# Altium footprint library KNR_Kurs.PcbLib: 250 footprints (part 13 of 16)
Each footprint in its own frame and in the unit in brackets; x right, y up, seen from the top. Pads: shape width x height; smd on the part's side, far side on the other; paste and mask are expansions set on the pad; w line width, h text height; cw(c..) or ccw(c..) is an arc to the next point about the centre after c.
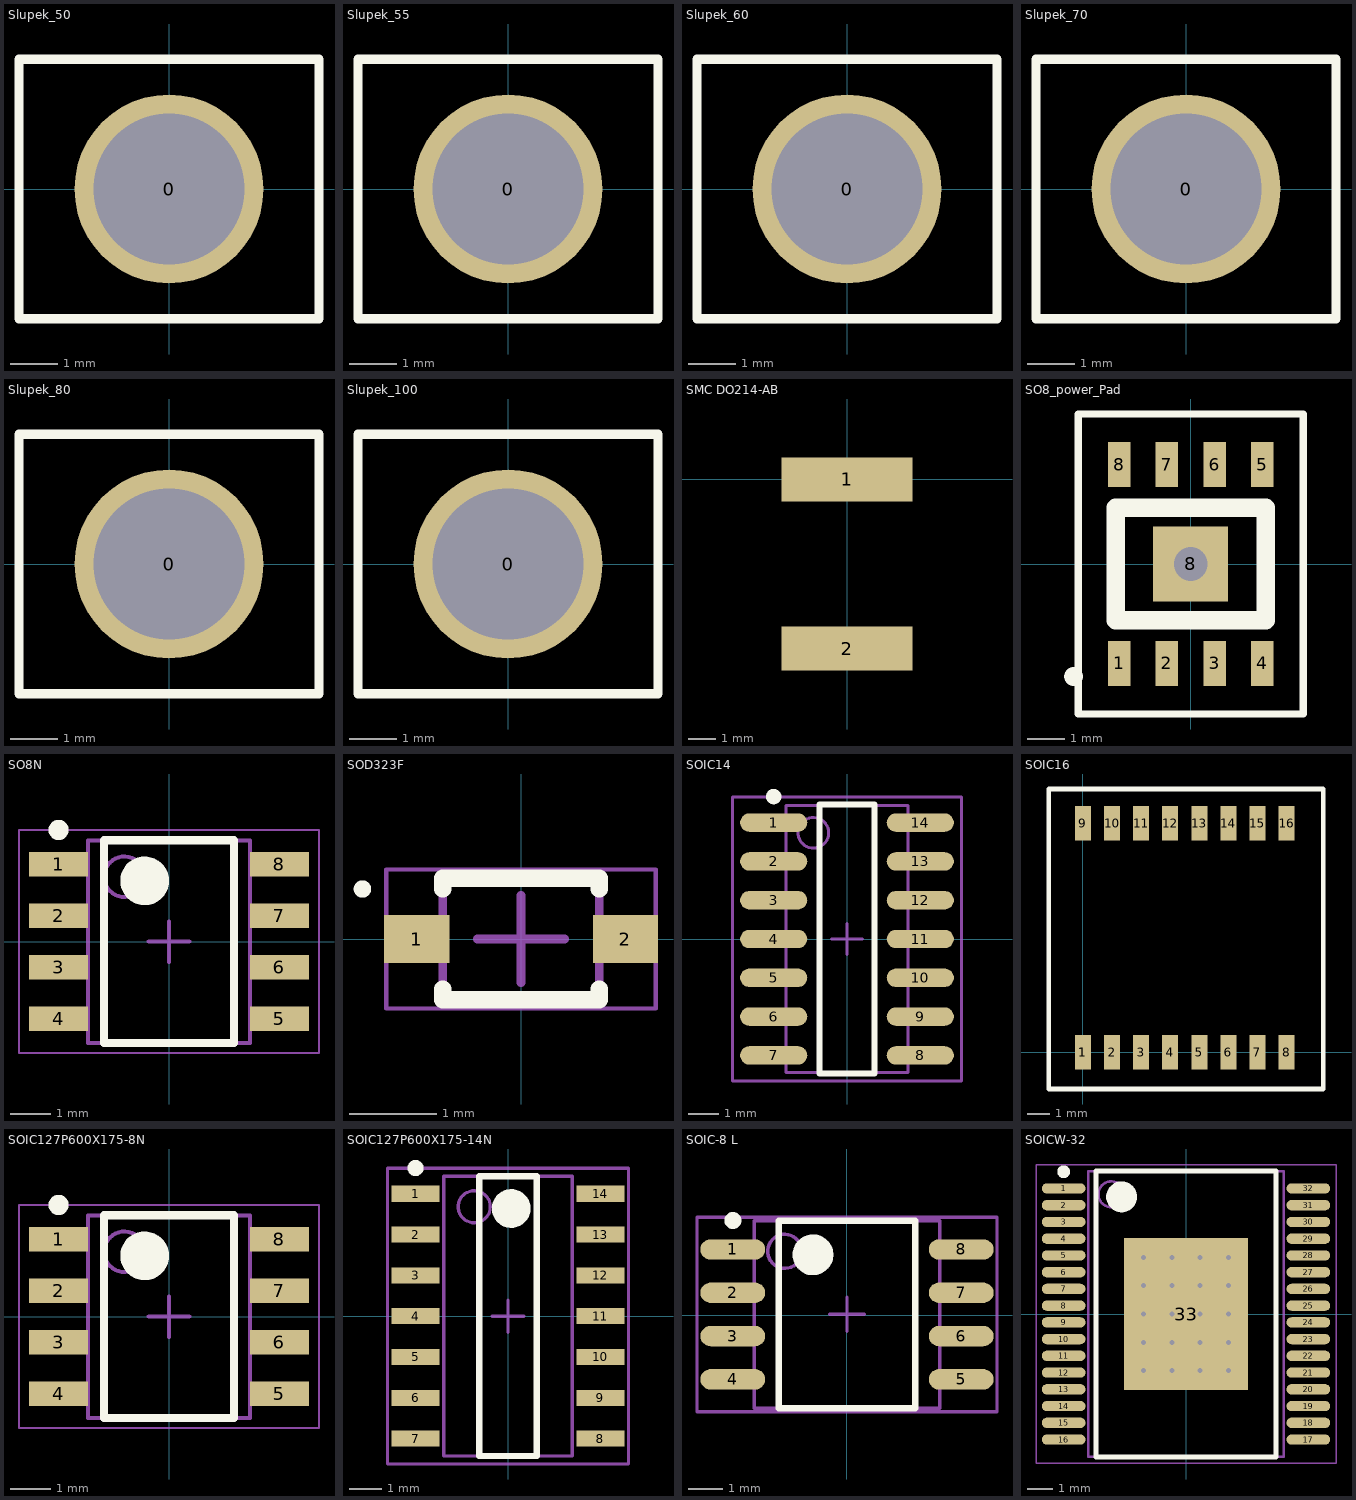
[diagram p12: the footprints below, top view; thin cyan lines are the x and y axes]

## Slupek_50 [mm] "M3, 5.5mm width"
pads (1):
  round 4 hole 3.2: 0(0,0)
Top Overlay:
  lines w0.2: -3.175,-2.75 -3.175,2.75 3.175,2.75 3.175,-2.75 -3.175,-2.75
3D body "Slupek_50.stp": height 50, standoff 0, extent -3.175,-2.75 3.175,2.75

## Slupek_55 [mm] "M3, 5.5mm width"
pads (1):
  round 4 hole 3.2: 0(0,0)
Top Overlay:
  lines w0.2: -3.175,-2.75 -3.175,2.75 3.175,2.75 3.175,-2.75 -3.175,-2.75
3D body "Slupek_55.stp": height 55, standoff 0, extent -3.175,-2.75 3.176,2.75

## Slupek_60 [mm] "M3, 5.5mm width"
pads (1):
  round 4 hole 3.2: 0(0,0)
Top Overlay:
  lines w0.2: -3.175,-2.75 3.175,-2.75 3.175,2.75 -3.175,2.75 -3.175,-2.75
3D body "Slupek_60.stp": height 60, standoff 0, extent -3.175,-2.75 3.175,2.75

## Slupek_70 [mm] "M3, 5.5mm width"
pads (1):
  round 4 hole 3.2: 0(0,0)
Top Overlay:
  lines w0.2: -3.175,-2.75 -3.175,2.75 3.175,2.75 3.175,-2.75 -3.175,-2.75
3D body "Slupek_70.stp": height 70, standoff 0, extent -3.175,-2.75 3.175,2.75

## Slupek_80 [mm] "M3, 5.5mm width"
pads (1):
  round 4 hole 3.2: 0(0,0)
Top Overlay:
  lines w0.2: -3.175,-2.75 3.175,-2.75 3.175,2.75 -3.175,2.75 -3.175,-2.75
3D body "Slupek_80.stp": height 80, standoff 0, extent -3.175,-2.75 3.175,2.75

## Slupek_100 [mm] "M3, 5.5mm width"
pads (1):
  round 4 hole 3.2: 0(0,0)
Top Overlay:
  lines w0.2: -3.175,-2.75 -3.175,2.75 3.175,2.75 3.175,-2.75 -3.175,-2.75
3D body "Slupek_100.stp": height 100, standoff 0, extent -3.175,-2.75 3.175,2.75

## SMC DO214-AB [mm] "Diode"
pads (2):
  rect 4.8x1.6 smd mask+0.07: 1(0,0) 2(0,-6.2)
3D body "User Library-DO-214AB SMC.step": height 2.3, standoff 0, extent -2.95,-7.075 2.95,0.875

## SO8_power_Pad [mm] "PowerSO8"
pads (9):
  rect 0.6x1.2 smd: 1(-1.905,-2.65) 2(-0.635,-2.65) 3(0.635,-2.65) 4(1.905,-2.65) 5(1.905,2.65) 6(0.635,2.65) 7(-0.635,2.65) 8(-1.905,2.65)
  rect 2x2 hole 0.9: 8(0,0)
Top Overlay:
  circle w0.25: c-3.125,-3 r0.125
  lines w0.2: -3,-4 3,-4 3,4 -3,4 -3,-4
  lines w0.5: -2,-1.5 2,-1.5 2,1.5 -2,1.5 -2,-1.5
3D body "PowerSO-8.stp": height 1.5, standoff 0, extent -2.5,-3 2.5,3

## SO8N [mm] "SOIC, 8-Leads, Body 4,90x3,90mm, Pitch 1,27mm, IPC Medium Density"
height 1.75
pads (8):
  rect 1.45x0.6 smd: 1(-2.725,1.905) 2(-2.725,0.635) 3(-2.725,-0.635) 4(-2.725,-1.905) 5(2.725,-1.905) 6(2.725,-0.635) 7(2.725,0.635) 8(2.725,1.905)
Top Overlay:
  circle w0.25: c-2.725,2.755 r0.125
  circle w0.6: c-0.6,1.5 r0.3
  lines w0.2: -1.6,-2.5 -1.6,2.5 1.6,2.5 1.6,-2.5 -1.6,-2.5
Mechanical 13:
  circle w0.1: c-1.1,1.6 r0.5
  lines w0.1: -2,-2.5 -2,2.5 2,2.5 2,-2.5 -2,-2.5
Mechanical 15:
  lines w0.05: -3.7,-2.75 -3.7,2.75 3.7,2.75 3.7,-2.75 -3.7,-2.75
  lines w0.1: -0.5,0 0.5,0 ; 0,-0.5 0,0.5
3D body "User Library-SO-8N.STEP": height 1.62, standoff 0, extent -3,-2.46 3,2.46

## SOD323F [mm] "SODFL, 2-Leads, Body 1,25x2,50mm, IPC High Density"
height 1
pads (2):
  rect 0.75x0.55 smd: 1(-1.2,0) 2(1.2,0)
Top Overlay:
  circle w0.1: c-1.825,0.575 r0.05
  lines w0.2: -0.9,-0.575 -0.9,-0.7 0.9,-0.7 0.9,-0.575 ; -0.9,0.575 -0.9,0.7 0.9,0.7 0.9,0.575
Mechanical 13:
  lines w0.1: -0.9,-0.675 -0.9,0.675 0.9,0.675 0.9,-0.675 -0.9,-0.675
Mechanical 15:
  lines w0.05: -1.55,-0.8 -1.55,0.8 1.55,0.8 1.55,-0.8 -1.55,-0.8
  lines w0.1: -0.5,0 0.5,0 ; 0,-0.5 0,0.5
3D body "User Library-SOD323F-1.step": height 1, standoff 0, extent -1.25,-0.675 1.25,0.675

## SOIC14 [mm] "SOIC, 14-Leads, Body 8.6x3.9mm, Pitch 1.27mm, IPC Medium Density"
height 1.75
pads (14):
  oval 2.2x0.6 smd: 1(-2.4,3.81) 2(-2.4,2.54) 3(-2.4,1.27) 4(-2.4,0) 5(-2.4,-1.27) 6(-2.4,-2.54) 7(-2.4,-3.81) 8(2.4,-3.81) 9(2.4,-2.54) 10(2.4,-1.27) 11(2.4,0) 12(2.4,1.27) 13(2.4,2.54) 14(2.4,3.81)
Top Overlay:
  circle w0.25: c-2.4,4.66 r0.125
  lines w0.2: -0.9,-4.4 0.9,-4.4 0.9,4.4 -0.9,4.4 -0.9,-4.4
Mechanical 13:
  circle w0.1: c-1.1,3.475 r0.5
  lines w0.1: -2,-4.375 2,-4.375 2,4.375 -2,4.375 -2,-4.375
Mechanical 15:
  lines w0.1: -0.5,0 0.5,0 ; 0,-0.5 0,0.5 ; -3.75,-4.65 3.75,-4.65 3.75,4.65 -3.75,4.65 -3.75,-4.65
3D body "SOP14.stp": height 1.8, standoff 0, extent -3,-4.4 3,4.3

## SOIC16 [mm]
pads (17):
  rect 0.7x1.5 smd: 1(0,0) 1(0,0) 2(1.27,0) 3(2.54,0) 4(3.81,0) 5(5.08,0) 6(6.35,0) 7(7.62,0) 8(8.89,0) 9(0,10) 10(1.27,10) 11(2.54,10) 12(3.81,10) 13(5.08,10) 14(6.35,10) 15(7.62,10) 16(8.89,10)
Top Overlay:
  lines w0.2: -1.5,-1.6 -1.5,11.5 10.5,11.5 10.5,-1.6 -1.5,-1.6
3D body "SOIC16.stp": height 3.5, standoff 0, extent -0.895,-0.3 9.775,10.3

## SOIC127P600X175-8N [mm] "SOIC, 8-Leads, Body 4,90x3,90mm, Pitch 1,27mm, IPC Medium Density"
height 1.75
pads (8):
  rect 1.45x0.6 smd: 1(-2.725,1.905) 2(-2.725,0.635) 3(-2.725,-0.635) 4(-2.725,-1.905) 5(2.725,-1.905) 6(2.725,-0.635) 7(2.725,0.635) 8(2.725,1.905)
Top Overlay:
  circle w0.25: c-2.725,2.755 r0.125
  circle w0.6: c-0.6,1.5 r0.3
  lines w0.2: -1.6,-2.5 -1.6,2.5 1.6,2.5 1.6,-2.5 -1.6,-2.5
Mechanical 13:
  circle w0.1: c-1.1,1.6 r0.5
  lines w0.1: -2,-2.5 -2,2.5 2,2.5 2,-2.5 -2,-2.5
Mechanical 15:
  lines w0.05: -3.7,-2.75 -3.7,2.75 3.7,2.75 3.7,-2.75 -3.7,-2.75
  lines w0.1: -0.5,0 0.5,0 ; 0,-0.5 0,0.5
3D body "User Library-SO-8N.STEP": height 1.62, standoff 0, extent -3,-2.46 3,2.46

## SOIC127P600X175-14N [mm] "SOIC, 14-Leads, Body 8,7x4,0mm (max), Pitch 1,27mm, IPC Medium Density"
height 1.75
pads (14):
  rect 1.5x0.5 smd: 1(-2.875,3.81) 2(-2.875,2.54) 3(-2.875,1.27) 4(-2.875,0) 5(-2.875,-1.27) 6(-2.875,-2.54) 7(-2.875,-3.81) 8(2.875,-3.81) 9(2.875,-2.54) 10(2.875,-1.27) 11(2.875,0) 12(2.875,1.27) 13(2.875,2.54) 14(2.875,3.81)
Top Overlay:
  circle w0.6: c0.1,3.35 r0.3
  circle w0.25: c-2.875,4.61 r0.125
  lines w0.2: -0.9,-4.35 0.9,-4.35 0.9,4.35 -0.9,4.35 -0.9,-4.35
Mechanical 13:
  circle w0.1: c-1.05,3.405 r0.5
  lines w0.1: -2,-4.355 2,-4.355 2,4.355 -2,4.355 -2,-4.355
Mechanical 15:
  lines w0.1: -0.5,0 0.5,0 ; 0,-0.5 0,0.5 ; -3.75,-4.6 3.75,-4.6 3.75,4.6 -3.75,4.6 -3.75,-4.6
3D body "SOIC14.stp": height 1.75, standoff 0, extent -3.1,-4.35 3.1,4.35

## SOIC-8 L [mm]
pads (8):
  oval 1.9x0.6 smd: 1(-3.35,1.93) 2(-3.35,0.66) 3(-3.35,-0.61) 4(-3.35,-1.88) 5(3.35,-1.88) 6(3.35,-0.61) 7(3.35,0.66) 8(3.35,1.93)
Top Overlay:
  circle w0.6: c-1,1.775 r0.3
  circle w0.25: c-3.35,2.78 r0.125
  lines w0.2: -2,-2.725 2,-2.725 2,2.775 -2,2.775 -2,-2.725
Mechanical 13:
  circle w0.1: c-1.825,1.875 r0.5
  lines w0.1: -2.725,-2.725 2.725,-2.725 2.725,2.775 -2.725,2.775 -2.725,-2.725
Mechanical 15:
  lines w0.1: -0.5,0.025 0.5,0.025 ; 0,-0.475 0,0.525 ; -4.4,-2.825 4.4,-2.825 4.4,2.875 -4.4,2.875 -4.4,-2.825
3D body: height 2.04, standoff 0, extent -2.725,-2.725 2.725,2.775

## SOICW-32 [mm] "SOIC, 32-Leads, Body 11,00x7,50mm, Pitch 1,27mm, Thermal Pad 5,90x4,80mm, IPC Medium Density"
height 2.45
pads (33):
  oval 1.7x0.4 smd: 1(-4.75,4.875) 2(-4.75,4.225) 3(-4.75,3.575) 4(-4.75,2.925) 5(-4.75,2.275) 6(-4.75,1.625) 7(-4.75,0.975) 8(-4.75,0.325) 9(-4.75,-0.325) 10(-4.75,-0.975) 11(-4.75,-1.625) 12(-4.75,-2.275) 13(-4.75,-2.925) 14(-4.75,-3.575) 15(-4.75,-4.225) 16(-4.75,-4.875) 17(4.75,-4.875) 18(4.75,-4.225) 19(4.75,-3.575) 20(4.75,-2.925) 21(4.75,-2.275) 22(4.75,-1.625) 23(4.75,-0.975) 24(4.75,-0.325) 25(4.75,0.325) 26(4.75,0.975) 27(4.75,1.625) 28(4.75,2.275) 29(4.75,2.925) 30(4.75,3.575) 31(4.75,4.225) 32(4.75,4.875)
  rect 4.8x5.9 smd: 33(0,0)
via 1.65,-2.2 diameter 0.5 hole 0.2
via 0.55,-2.2 diameter 0.5 hole 0.2
via -0.55,-2.2 diameter 0.5 hole 0.2
via -1.65,-2.2 diameter 0.5 hole 0.2
via 1.65,-1.1 diameter 0.5 hole 0.2
via 0.55,-1.1 diameter 0.5 hole 0.2
via -0.55,-1.1 diameter 0.5 hole 0.2
via -1.65,-1.1 diameter 0.5 hole 0.2
via 1.65,0 diameter 0.5 hole 0.2
via 0.55,0 diameter 0.5 hole 0.2
via -0.55,0 diameter 0.5 hole 0.2
via -1.65,0 diameter 0.5 hole 0.2
via 1.65,1.1 diameter 0.5 hole 0.2
via 0.55,1.1 diameter 0.5 hole 0.2
via -0.55,1.1 diameter 0.5 hole 0.2
via -1.65,1.1 diameter 0.5 hole 0.2
via 1.65,2.2 diameter 0.5 hole 0.2
via 0.55,2.2 diameter 0.5 hole 0.2
via -0.55,2.2 diameter 0.5 hole 0.2
via -1.65,2.2 diameter 0.5 hole 0.2
Top Overlay:
  circle w0.6: c-2.5,4.55 r0.3
  circle w0.25: c-4.75,5.525 r0.125
  lines w0.2: -3.5,-5.55 3.5,-5.55 3.5,5.55 -3.5,5.55 -3.5,-5.55
Mechanical 13:
  circle w0.1: c-2.9,4.65 r0.5
  lines w0.1: -3.8,-5.55 3.8,-5.55 3.8,5.55 -3.8,5.55 -3.8,-5.55
Mechanical 15:
  lines w0.05: -5.825,-5.8 5.825,-5.8 5.825,5.8 -5.825,5.8 -5.825,-5.8
  lines w0.1: -0.5,0 0.5,0 ; 0,-0.5 0,0.5
3D body: height 2.45, standoff 0, extent -3.8,-5.55 3.8,5.55